# Altium footprint library 电容.PcbLib: 194 footprints (part 13 of 13)
Each footprint in its own frame and in the unit in brackets; x right, y up, seen from the top. Pads: shape width x height; smd on the part's side, far side on the other; paste and mask are expansions set on the pad; w line width, h text height; cw(c..) or ccw(c..) is an arc to the next point about the centre after c.
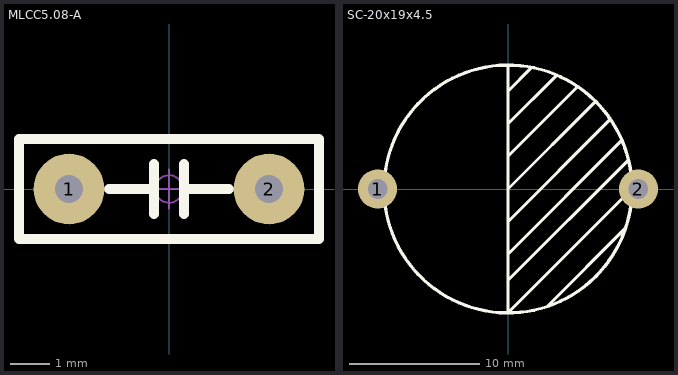
[diagram p12: the footprints below, top view; thin cyan lines are the x and y axes]

## MLCC5.08-A [mm] "独石电容，脚距5.08mm"
pads (2):
  round 1.8 hole 0.7: 1(-2.54,0) 2(2.54,0)
Top Overlay:
  lines w0.254: -1.524,0 -0.381,0 ; -0.381,-0.635 -0.381,0.635 ; 0.381,-0.635 0.381,0.635 ; 0.381,0 1.524,0 ; -3.81,-1.27 -3.81,1.27 3.81,1.27 3.81,-1.27 -3.81,-1.27
Mechanical 15:
  circle w0.05: c0,0 r0.35
  lines w0.05: -0.5,0 0.5,0 ; 0,-0.5 0,0.5
3D body: height 3.71, standoff -2.61, extent -2.79,-1.003 2.79,1.003

## SC-20x19x4.5 [mm] "脚距：20，直径：19，高：4.5"
pads (2):
  round 3 hole 1.5: 1(-10,0) 2(10,0)
Top Overlay:
  circle w0.254: c0,0 r9.5
  lines w0.254: 0,-5 8.723,3.723 ; 0,0 6.706,6.706 ; 0,2.5 5.329,7.829 ; 0,9.5 0,-9.5 9.5,0 ; 1.8,9.3 0,7.5 ; 2.99,-9.01 9,-3 ; 3.736,8.736 0,5 ; 7.765,5.265 0,-2.5 ; 9.202,2.202 0,-7 ; 0,-7 0,-7.5 0,-7 ; 0,-2.5 0,-2.5 ; 0,5 0,5 ; 0,7.5 0,7.5
3D body: height 6.38, standoff -3.52, extent -10.1,-9.5 10.1,9.5